# Altium footprint library miniVent_PCB_v1_01.PcbLib: 32 footprints (part 1 of 2)
Each footprint in its own frame and in the unit in brackets; x right, y up, seen from the top. Pads: shape width x height; smd on the part's side, far side on the other; paste and mask are expansions set on the pad; w line width, h text height; cw(c..) or ccw(c..) is an arc to the next point about the centre after c.
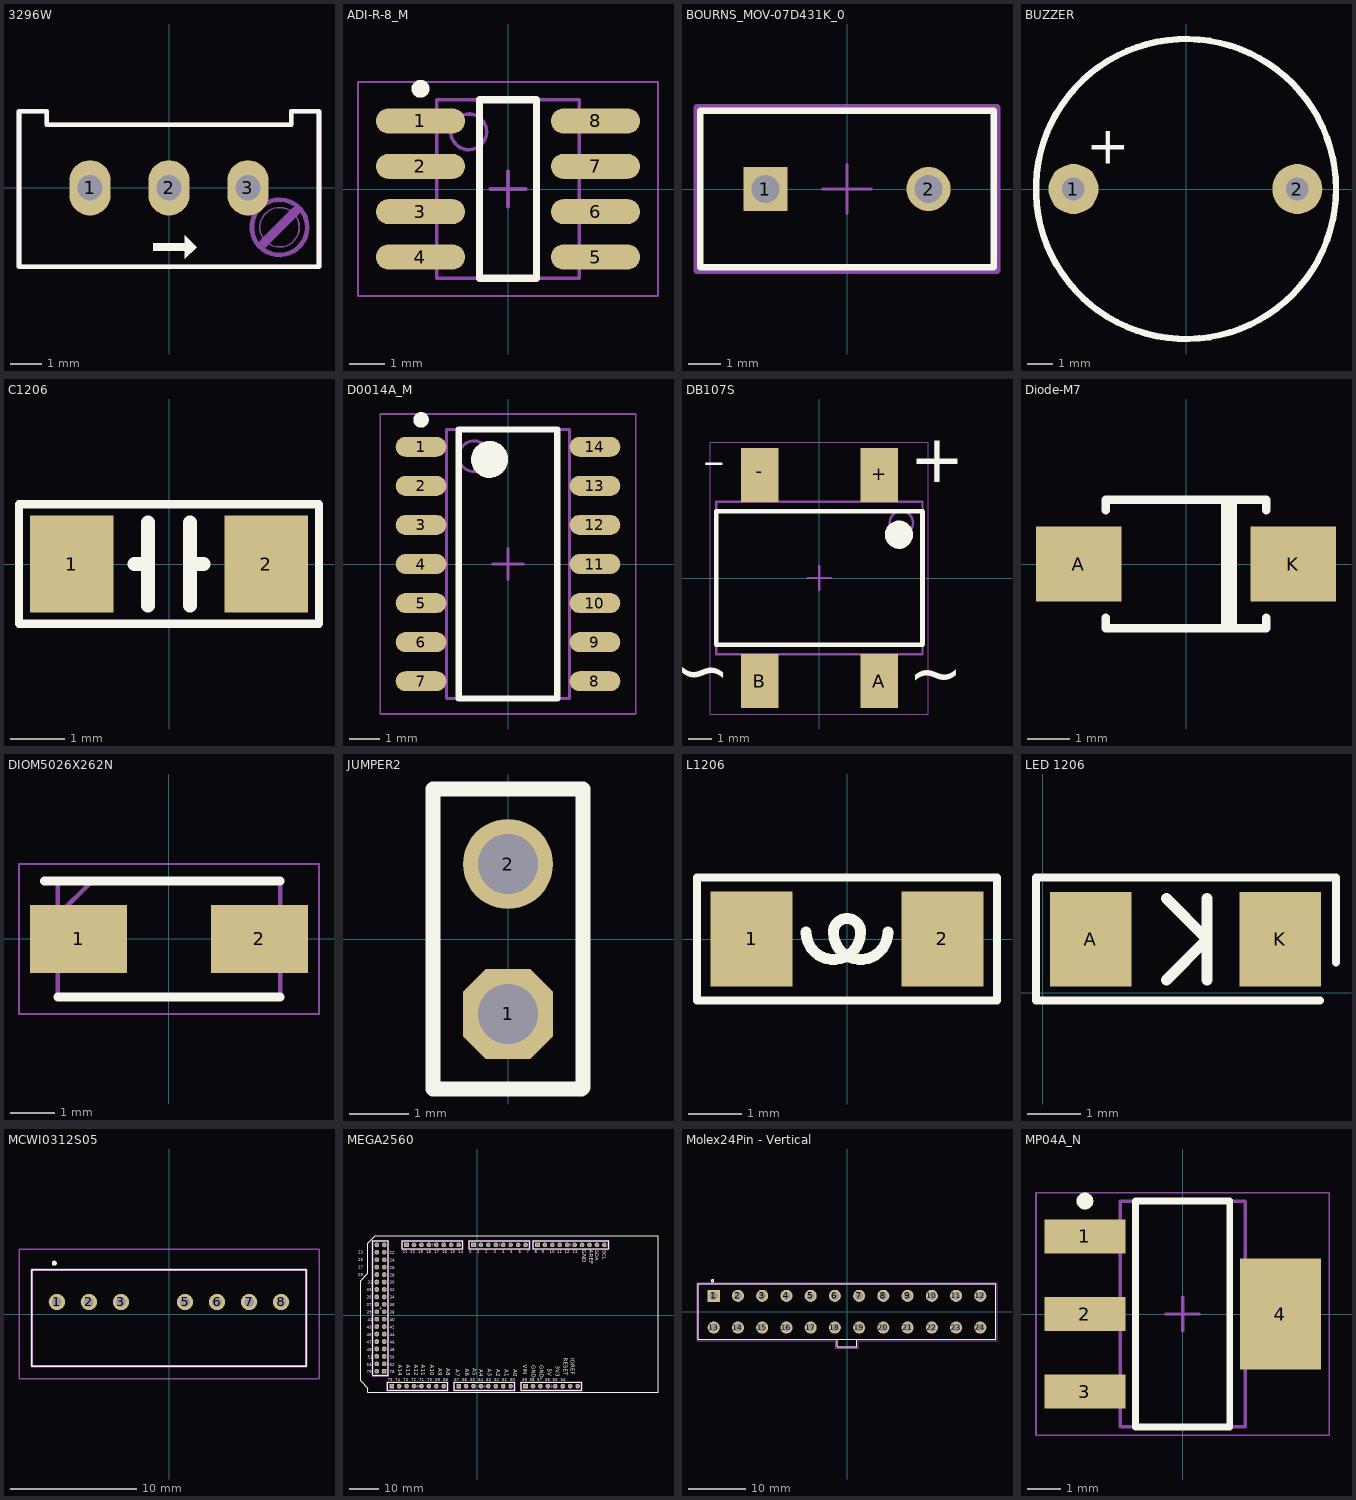
[diagram p0: the footprints below, top view; thin cyan lines are the x and y axes]

## 3296W [mil]
pads (3):
  oval 52x70 hole 32: 1(-100,0) 2(0,0) 3(100,0)
Top Overlay:
  rectangle: -19.99,-80 20.01,-70
  region: 20,-60 20,-90 35,-75
  lines w6: -190,-100 -190,97 -155,97 -155,80 155,80 155,97 190,97 190,-100 -190,-100
Mechanical 1:
  circle w6: c140,-50 r35
  circle w2: c140,-50 r25
  lines w6: -190,-100 190,-100 190,97 155,97 155,80 -155,80 -155,97 -190,97 -190,-100
  lines w12: 120,-70 160,-30
3D body "SW3dPS-bourns 3296W pot.STEP": height 454.72, standoff -251.97, extent -187.19,-96 188,94.2

## ADI-R-8_M [mm] "SOIC, 8-Leads, Body 4.9x3.9mm, Pitch 1.27mm, IPC Low Density"
height 1.75
pads (8):
  oval 2.5x0.7 smd: 1(-2.45,1.905) 2(-2.45,0.635) 3(-2.45,-0.635) 4(-2.45,-1.905) 5(2.45,-1.905) 6(2.45,-0.635) 7(2.45,0.635) 8(2.45,1.905)
Top Overlay:
  circle w0.25: c-2.45,2.805 r0.125
  lines w0.2: -0.8,-2.5 -0.8,2.5 0.8,2.5 0.8,-2.5 -0.8,-2.5
Mechanical 13:
  circle w0.1: c-1.1,1.6 r0.5
  lines w0.1: -2,-2.5 -2,2.5 2,2.5 2,-2.5 -2,-2.5
Mechanical 15:
  lines w0.05: -4.2,-3 -4.2,3 4.2,3 4.2,-3 -4.2,-3
  lines w0.1: -0.5,0 0.5,0 ; 0,-0.5 0,0.5
3D body: height 1.75, standoff 0.1, extent -2,-2.5 2,2.5

## BOURNS_MOV-07D431K_0 [mm]
pads (2):
  rect 1.35x1.35 hole 0.85 paste-1000 mask+0: 1(-2.5,0)
  round 1.35 hole 0.85 paste-1000 mask+0: 2(2.5,0)
Top Overlay:
  lines w0.2: -4.5,-2.4 4.5,-2.4 4.5,2.4 -4.5,2.4 -4.5,-2.4
Mechanical 10:
  lines w0.2: -4.6,-2.5 4.6,-2.5 4.6,2.5 -4.6,2.5 -4.6,-2.5
  text ".Designator" at 0,0 h1
Mechanical 12:
  lines w0.15: -4.5,-2.4 4.5,-2.4 4.5,2.4 -4.5,2.4 -4.5,-2.4
Mechanical 15:
  lines w0.1: -0.75,0 0.75,0 ; 0,-0.75 0,0.75
  lines w0.2: -4.6,-2.5 4.6,-2.5 4.6,2.5 -4.6,2.5 -4.6,-2.5
3D body "3dmodel.step": height 0.25, standoff 0, extent -4.6,-2.5 4.6,2.5

## BUZZER [mm] "BUZZER"
pads (2):
  round 2 hole 0.9: 1(-4.5,0) 2(4.45,0)
Top Overlay:
  circle w0.254: c0,0 r6
  text "+" at -4,1 h1.52

## C1206 [mil]
pads (2):
  rect 60x70 smd: 1(-70,0) 2(70,0)
Top Overlay:
  lines w5.91: -107.87,-42.91 -107.87,42.91 107.87,42.91 107.87,-42.91 -107.87,-42.91
  lines w10: -25,0 -15,0 ; -15,-30 -15,30 ; 15,-30 15,30 ; 15,0 25,0
3D body "User Library-cap1206.STEP": height 37.4, standoff -0.39, extent -80.43,-34.09 84.92,36.77

## D0014A_M [mm] "SOIC, 14-Leads, Body 8.75x4mm, Pitch 1.27mm, IPC Low Density"
height 1.75
pads (14):
  oval 1.65x0.65 smd: 1(-2.825,3.81) 2(-2.825,2.54) 3(-2.825,1.27) 4(-2.825,0) 5(-2.825,-1.27) 6(-2.825,-2.54) 7(-2.825,-3.81) 8(2.825,-3.81) 9(2.825,-2.54) 10(2.825,-1.27) 11(2.825,0) 12(2.825,1.27) 13(2.825,2.54) 14(2.825,3.81)
Top Overlay:
  circle w0.6: c-0.6,3.4 r0.3
  circle w0.25: c-2.825,4.685 r0.125
  lines w0.2: -1.6,-4.375 1.6,-4.375 1.6,4.375 -1.6,4.375 -1.6,-4.375
Mechanical 13:
  circle w0.1: c-1.1,3.5 r0.5
  lines w0.1: -2,-4.375 2,-4.375 2,4.375 -2,4.375 -2,-4.375
Mechanical 15:
  lines w0.05: -4.15,-4.875 4.15,-4.875 4.15,4.875 -4.15,4.875 -4.15,-4.875
  lines w0.1: -0.5,0 0.5,0 ; 0,-0.5 0,0.5
3D body "SOIC-14akaD0014AakaM14A.stp": height 1.59, standoff -0.01, extent -3.023,-4.318 3.022,4.318

## DB107S [mm] "SOP, 4-Leads, Body 8.30x6.35mm, Pitch 5.10mm, IPC Medium Density"
height 3.4
pads (4):
  rect 1.6x2.3 smd: +(2.55,4.4) -(-2.55,4.4) A(2.55,-4.4) B(-2.55,-4.4)
Top Overlay:
  circle w0.6: c3.4,1.85 r0.3
  lines w0.2: -4.4,-2.85 -4.4,2.85 4.4,2.85 4.4,-2.85 -4.4,-2.85
  text "+" at 3.861,3.4 h3.5
  text "-" at -5,3.5 h3.5
  text "~" at 3.8,-5.7 h3.5
  text "~" at -3.8,-5.6 h3.5
Mechanical 13:
  circle w0.1: c3.5,2.35 r0.5
  lines w0.1: -4.4,-3.25 -4.4,3.25 4.4,3.25 4.4,-3.25 -4.4,-3.25
Mechanical 15:
  lines w0.05: -4.65,-5.8 -4.65,5.8 4.65,5.8 4.65,-5.8 -4.65,-5.8
  lines w0.1: -0.5,0 0.5,0 ; 0,-0.5 0,0.5
3D body "SOP510P990X340-4N.step": height 3.4, standoff 0, extent -4.4,-4.95 4.4,4.95

## Diode-M7 [mil]
pads (2):
  rect 80x70 smd: A(-100,0) K(100,0)
Top Overlay:
  lines w7.87: -75,-60 75,-60 ; -75,60 75,60
  lines w8: -75,-60 -75,-50 ; -75,50 -75,60 ; 75,-60 75,-50 ; 75,50 75,60
  lines w15: 40,-55 40,55

## DIOM5026X262N [mm]
pads (2):
  rect 2.2x1.55 smd: 1(-2.05,0) 2(2.05,0)
Top Overlay:
  lines w0.2: -2.825,1.312 2.52,1.312 ; -2.52,-1.312 2.52,-1.312
Mechanical 13:
  lines w0.1: -2.52,0.538 -1.745,1.312 ; -2.52,-1.312 2.52,-1.312 2.52,1.312 -2.52,1.312 -2.52,-1.312
Mechanical 15:
  lines w0.05: -3.4,-1.7 3.4,-1.7 3.4,1.7 -3.4,1.7 -3.4,-1.7
3D body "SS34A.stp": height 2.62, standoff 0, extent -2.52,-1.312 2.52,1.312

## JUMPER2 [mil]
pads (2):
  oct 60x60 hole 40: 1(0,-50)
  round 60 hole 40: 2(0,50)
Top Overlay:
  lines w10: -50,-100 -50,100 50,100 50,0 50,-99 49,-100 -50,-100
3D body "pin_header_aw_108_02-t.stp": height 98.11, standoff -390.08, extent -53.28,-95 45,105
3D body "jumper_aksct_g-black.stp": height 404.72, standoff 150, extent -46.06,-98.03 50,98.03

## L1206 [mil]
pads (2):
  rect 60x70 smd: 1(-70,0) 2(70,0)
Top Overlay:
  lines w5.91: -110,-45 -110,45 110,45 110,-45 -110,-45
  lines w8: -30,5 ccw(c-10,5) 10,5 ccw(c0,5) -10,5 ccw(c10,5) 30,5
3D body "User Library-1206 Ferrite bead.step": height 49.25, standoff -2.01, extent -64.56,-31.46 61.43,31.54

## LED 1206 [mil]
pads (2):
  rect 60x70 smd: A(35.43,39.37) K(175.43,39.37)
Top Overlay:
  lines w5.91: 204.72,-5.91 -5,-5.91 -5,85 216.54,85 216.54,22.05
  lines w8: 91.3,9.37 121.3,39.37 91.3,69.37 ; 121.3,9.37 121.3,69.37
3D body "User Library-LED 1206 BLUE.step": height 43.31, standoff 0, extent 40.95,7.87 166.94,70.87

## MCWI0312S05 [mm]
pads (7):
  round 1.303 hole 0.76: 1(-8.89,0.953) 2(-6.35,0.953) 3(-3.81,0.953) 5(1.27,0.953) 6(3.81,0.953) 7(6.35,0.953) 8(8.89,0.953)
Top Overlay:
  lines w0.1: -10.9,-4.127 10.9,-4.127 10.9,3.528 -10.9,3.528 -10.9,-4.127
  lines w0.2: -9.199,4.028 ccw(c-9.099,4.028) -9,4.028 ccw(c-9.099,4.028) -9.199,4.028
Mechanical 13:
  lines w0.2: -10.9,-4.127 10.9,-4.127 10.9,3.528 -10.9,3.528 -10.9,-4.127
Mechanical 15:
  lines w0.1: -11.9,-5.127 11.9,-5.127 11.9,5.127 -11.9,5.127 -11.9,-5.127

## MEGA2560 [mm] "Arduino 2560"
pads (86):
  rect 1.6x1.6 hole 1.1: 0(-1.27,24.13) 8(20.574,24.13) 21(-24.13,24.13) 59(16.51,-24.13) 67(-6.35,-24.13) 75(-29.21,-24.13)
  round 1.6 hole 1.1: 1(1.27,24.13) 2(3.81,24.13) 3(6.35,24.13) 4(8.89,24.13) 5(11.43,24.13) 6(13.97,24.13) 7(16.51,24.13) 9(23.114,24.13) 10(25.654,24.13) 11(28.194,24.13) 12(30.734,24.13) 13(33.274,24.13) 14(-6.35,24.13) 15(-8.89,24.13) 16(-11.43,24.13) 17(-13.97,24.13) 18(-16.51,24.13) 19(-19.05,24.13) 20(-21.59,24.13) 54(29.21,-24.13) 55(26.67,-24.13) 56(24.13,-24.13) 57(21.59,-24.13) 58(19.05,-24.13) 60(11.43,-24.13) 61(8.89,-24.13) 62(6.35,-24.13) 63(3.81,-24.13) 64(1.27,-24.13) 65(-1.27,-24.13) 66(-3.81,-24.13) 68(-11.43,-24.13) 69(-13.97,-24.13) 70(-16.51,-24.13) 71(-19.05,-24.13) 72(-21.59,-24.13) 73(-24.13,-24.13) 74(-26.67,-24.13) 76(35.814,24.13) 77(38.354,24.13) 82(40.894,24.13) 83(43.434,24.13) 84(31.75,-24.13) 85(34.29,-24.13)
  round 1.65 hole 1.1: 22(-31.75,21.59) 23(-34.29,21.59) 24(-31.75,19.05) 25(-34.29,19.05) 26(-31.75,16.51) 27(-34.29,16.51) 28(-31.75,13.97) 29(-34.29,13.97) 30(-31.75,11.43) 31(-34.29,11.43) 32(-31.75,8.89) 33(-34.29,8.89) 34(-31.75,6.35) 35(-34.29,6.35) 36(-31.75,3.81) 37(-34.29,3.81) 38(-31.75,1.27) 39(-34.29,1.27) 40(-31.75,-1.27) 41(-34.29,-1.27) 42(-31.75,-3.81) 43(-34.29,-3.81) 44(-31.75,-6.35) 45(-34.29,-6.35) 46(-31.75,-8.89) 47(-34.29,-8.89) 48(-31.75,-11.43) 49(-34.29,-11.43) 50(-31.75,-13.97) 51(-34.29,-13.97) 52(-31.75,-16.51) 53(-34.29,-16.51) 79(-34.29,-19.05) 80(-34.29,24.13) 81(-31.75,24.13)
  rect 1.65x1.65 hole 1.1: 78(-31.75,-19.05)
Top Overlay:
  lines w0.2: -35.635,-20.47 -30.405,-20.47 -30.405,25.55 -35.635,25.55 -35.635,-20.47 ; -30.63,-25.475 -10.01,-25.475 -10.01,-22.785 -30.63,-22.785 -30.63,-25.475 ; -25.55,22.785 -4.93,22.785 -4.93,25.475 -25.55,25.475 -25.55,22.785 ; -7.77,-25.475 12.85,-25.475 12.85,-22.785 -7.77,-22.785 -7.77,-25.475 ; -2.69,22.785 17.93,22.785 17.93,25.475 -2.69,25.475 -2.69,22.785 ; 15.09,-25.475 35.71,-25.475 35.71,-22.785 15.09,-22.785 15.09,-25.475 ; 19.154,22.785 19.154,25.475 44.854,25.475 44.854,22.785 19.154,22.785
  lines w0.254: -37.31,14.469 -39.85,11.929 -39.85,-22.351 -37.31,-24.891 -37.31,-26.161 60.11,-26.161 61.75,-26.161 61.75,-24.521 61.75,27.179 -34.77,27.179 -37.31,24.639 -37.31,14.479
  text "66" at -5.135,-22.427 h1.02
  text "69" at -14.346,-22.427 h1.02
  text "12" at 29.945,21.284 h1.02
  text "GND" at 35.28,22.452 h2.36
  text "AREF" at 37.82,22.452 h2.36
  text "SCL" at 42.879,22.331 h1.21
  text "SDA" at 40.288,22.331 h1.21
  text "14" at -6.398,21.284 h1.02
  text "15" at -9.138,21.284 h1.02
  text "16" at -11.878,21.284 h1.02
  text "17" at -14.617,21.284 h1.02
  text "18" at -17.357,21.284 h1.02
  text "19" at -20.096,21.284 h1.02
  text "20" at -22.836,21.284 h1.02
  text "21" at -25.423,21.284 h1.02
  text "7" at 16.97,21.284 h1.02
  text "6" at 14.139,21.284 h1.02
  text "5" at 11.309,21.284 h1.02
  text "4" at 8.479,21.284 h1.02
  text "3" at 5.648,21.284 h1.02
  text "2" at 2.818,21.284 h1.02
  text "1" at -0.012,21.284 h1.02
  text "0" at -2.69,21.284 h1.02
  text "8" at 19.662,21.284 h1.02
  text "13" at 32.554,21.284 h1.02
  text "11" at 27.336,21.284 h1.02
  text "10" at 24.727,21.284 h1.02
  text "9" at 22.119,21.284 h1.02
  text "22" at -29.92,20.953 h1.02
  text "24" at -29.92,18.405 h1.02
  text "26" at -29.92,15.857 h1.02
  text "28" at -29.92,13.309 h1.02
  text "30" at -29.92,10.761 h1.02
  text "32" at -29.92,8.213 h1.02
  text "34" at -29.92,5.665 h1.02
  text "36" at -29.92,3.117 h1.02
  text "38" at -29.92,0.569 h1.02
  text "40" at -29.92,-1.979 h1.02
  text "42" at -29.92,-4.527 h1.02
  text "44" at -29.92,-7.075 h1.02
  text "46" at -29.92,-9.623 h1.02
  text "48" at -29.92,-12.171 h1.02
  text "50" at -29.92,-14.719 h1.02
  text "52" at -29.92,-17.266 h1.02
  text "78" at -29.92,-19.662 h1.02
  text "23" at -40.715,21.08 h1.02
  text "25" at -40.715,18.532 h1.02
  text "27" at -40.715,15.984 h1.02
  text "29" at -40.715,13.436 h1.02
  text "31" at -37.455,10.761 h1.02
  text "33" at -37.794,8.213 h1.02
  text "35" at -37.794,5.665 h1.02
  text "37" at -37.794,3.117 h1.02
  text "39" at -37.794,0.569 h1.02
  text "41" at -37.455,-1.979 h1.02
  text "43" at -37.794,-4.527 h1.02
  text "45" at -37.794,-7.075 h1.02
  text "47" at -37.794,-9.623 h1.02
  text "49" at -37.794,-12.171 h1.02
  text "51" at -37.455,-14.719 h1.02
  text "53" at -37.794,-17.266 h1.02
  text "79" at -37.794,-19.662 h1.02
  text "68" at -11.587,-22.427 h1.02
  text "70" at -17.086,-22.427 h1.02
  text "71" at -19.825,-22.427 h1.02
  text "72" at -22.565,-22.427 h1.02
  text "73" at -25.304,-22.427 h1.02
  text "74" at -28.044,-22.427 h1.02
  text "75" at -30.631,-22.427 h1.02
  text "60" at 11.255,-22.427 h1.02
  text "61" at 8.515,-22.427 h1.02
  text "62" at 5.775,-22.427 h1.02
  text "63" at 3.036,-22.427 h1.02
  text "64" at 0.296,-22.427 h1.02
  text "65" at -2.443,-22.427 h1.02
  text "67" at -7.77,-22.427 h1.02
  text "59" at 15.446,-22.427 h1.02
  text "58" at 17.935,-22.427 h1.02
  text "54" at 28.501,-22.427 h1.02
  text "55" at 25.86,-22.427 h1.02
  text "56" at 23.218,-22.427 h1.02
  text "57" at 20.576,-22.427 h1.02
  text "IOREF" at 31.496,-14.598 h2.36
  text "RESET" at 29.096,-14.51 h2.36
  text "3V3" at 26.336,-17.183 h2.36
  text "5V" at 23.575,-18.256 h2.36
  text "GND" at 20.814,-16.992 h2.36
  text "GND" at 18.054,-16.992 h2.36
  text "A0" at 11.762,-18.288 h2.36
  text "A1" at 8.858,-18.288 h2.36
  text "A2" at 5.953,-18.302 h2.36
  text "VIN" at 15.293,-16.886 h2.36
  text "A3" at 3.048,-18.263 h2.36
  text "A4" at 0.144,-18.306 h2.36
  text "A5" at -2.058,-18.07 h2.36
  text "A6" at -4.598,-18.237 h2.36
  text "A7" at -7.922,-18.309 h2.36
  text "A8" at -11.049,-18.098 h2.36
  text "A9" at -13.808,-18.045 h2.36
  text "A10" at -16.548,-16.846 h2.36
  text "A11" at -19.612,-16.846 h2.36
  text "A13" at -24.767,-16.82 h2.36
  text "A12" at -22.027,-16.859 h2.36
  text "A14" at -27.492,-16.864 h2.36
Mechanical 13:
  lines w0.1: -35.56,-20.32 -35.56,25.4 -30.48,25.4 -30.48,-20.32 -35.56,-20.32 ; -30.48,-25.4 -30.48,-22.86 -10.16,-22.86 -10.16,-25.4 -30.48,-25.4 ; -25.4,22.86 -25.4,25.4 -5.08,25.4 -5.08,22.86 -25.4,22.86 ; -7.62,-25.4 -7.62,-22.86 12.7,-22.86 12.7,-25.4 -7.62,-25.4 ; -2.54,22.86 -2.54,25.4 17.78,25.4 17.78,22.86 -2.54,22.86 ; 15.24,-25.4 15.24,-22.86 35.56,-22.86 35.56,-25.4 15.24,-25.4 ; 19.304,22.86 44.704,22.86 44.704,25.4 19.304,25.4 19.304,22.86
Mechanical 15:
  lines w0.05: -33.52,2.54 -32.52,2.54 ; -33.02,2.04 -33.02,3.04 ; -20.82,-24.13 -19.82,-24.13 ; -20.32,-24.63 -20.32,-23.63 ; -15.74,24.13 -14.74,24.13 ; -15.24,23.63 -15.24,24.63 ; 2.04,-24.13 3.04,-24.13 ; 2.54,-24.63 2.54,-23.63 ; 7.12,24.13 8.12,24.13 ; 7.62,23.63 7.62,24.63 ; 24.9,-24.13 25.9,-24.13 ; 25.4,-24.63 25.4,-23.63 ; 31.504,24.13 32.504,24.13 ; 32.004,23.63 32.004,24.63 ; -35.835,-20.67 -30.205,-20.67 -30.205,25.75 -35.835,25.75 -35.835,-20.67 ; -30.83,-25.675 -30.83,-22.585 -9.81,-22.585 -9.81,-25.675 -30.83,-25.675 ; -25.75,22.585 -25.75,25.675 -4.73,25.675 -4.73,22.585 -25.75,22.585 ; -7.97,-25.675 -7.97,-22.585 13.05,-22.585 13.05,-25.675 -7.97,-25.675 ; -2.89,22.585 -2.89,25.675 18.13,25.675 18.13,22.585 -2.89,22.585 ; 14.89,-25.675 14.89,-22.585 35.91,-22.585 35.91,-25.675 14.89,-25.675 ; 18.954,22.585 45.054,22.585 45.054,25.675 18.954,25.675 18.954,22.585
3D body "61300811121.stp": height 8.57, standoff -2.97, extent -25.4,22.86 -5.08,25.4
3D body "61300811121.stp": height 8.57, standoff -2.97, extent -2.54,22.86 17.78,25.4
3D body "61303621121.stp": height 8.59, standoff -2.95, extent -35.56,-20.32 -30.48,25.4
3D body "61300811121.stp": height 8.57, standoff -2.97, extent -30.48,-25.4 -10.16,-22.86
3D body "61300811121.stp": height 8.57, standoff -2.97, extent -7.62,-25.4 12.7,-22.86
3D body "61301011121.stp": height 8.57, standoff -2.97, extent 19.304,22.86 44.704,25.4
3D body "61300811121.stp": height 8.57, standoff -2.97, extent 15.24,-25.4 35.56,-22.86
3D body "arduino MEGA2650.SLDPRT": height 16.2, standoff 0.95, extent -39.878,-26.162 68.072,27.178

## Molex24Pin - Vertical [mm] "Molex ATX 24Pin"
height 8.54
pads (24):
  rect 2.1x2.1 hole 1.4: 1(-23.1,2.75)
  round 2.1 hole 1.4: 2(-18.9,2.75) 3(-14.7,2.75) 4(-10.5,2.75) 5(-6.3,2.75) 6(-2.1,2.75) 7(2.1,2.75) 8(6.3,2.75) 9(10.5,2.75) 10(14.7,2.75) 11(18.9,2.75) 12(23.1,2.75) 13(-23.1,-2.75) 14(-18.9,-2.75) 15(-14.7,-2.75) 16(-10.5,-2.75) 17(-6.3,-2.75) 18(-2.1,-2.75) 19(2.1,-2.75) 20(6.3,-2.75) 21(10.5,-2.75) 22(14.7,-2.75) 23(18.9,-2.75) 24(23.1,-2.75)
Top Overlay:
  circle w0.203: c-23.3,5.35 r0.2
  lines w0.127: -1.7,-4.8 1.7,-4.8 ; -1.7,-4.8 -25.75,-4.8 -25.75,4.8 25.75,4.8 25.75,-4.8 1.7,-4.8 ; -1.7,-4.8 -1.7,-6.1 1.7,-6.1 1.7,-4.8
Mechanical 13:
  circle w0.203: c-23.3,5.35 r0.2
  lines w0.127: -1.7,-4.8 -25.75,-4.8 -25.75,4.8 25.75,4.8 25.75,-4.8 1.7,-4.8 ; -1.7,-4.8 1.7,-4.8 ; -1.7,-4.8 -1.7,-6.1 1.7,-6.1 1.7,-4.8
Mechanical 15:
  lines w0.05: -26,-5.05 -1.95,-5.05 -1.95,-6.35 1.95,-6.35 1.95,-5.05 26,-5.05 26,5.05 -26,5.05 -26,-0.54 -26,-4.04 -26,-5.05
3D body "plug_cpu_power_female_24-pin.stp": height 24.88, standoff 0, extent -26.67,-6.096 27.23,6.204

## MP04A_N [mm] "SOT223, 4-Leads, Body 6.5x3.5mm, Pitch 2.3mm, Lead Span 7mm, IPC Medium Density"
height 1.8
pads (4):
  rect 2.4x1 smd: 1(-2.9,2.3) 2(-2.9,0) 3(-2.9,-2.3)
  rect 2.4x3.3 smd: 4(2.9,0)
Top Overlay:
  circle w0.25: c-2.9,3.35 r0.125
  lines w0.2: -1.4,-3.35 -1.4,3.35 1.4,3.35 1.4,-3.35 -1.4,-3.35
Mechanical 13:
  lines w0.1: -1.855,-3.35 -1.855,3.35 1.855,3.35 1.855,-3.35 -1.855,-3.35
Mechanical 15:
  lines w0.05: -4.35,-3.6 -4.35,3.6 4.35,3.6 4.35,-3.6 -4.35,-3.6
  lines w0.1: -0.5,0 0.5,0 ; 0,-0.5 0,0.5
3D body: height 1.8, standoff 0.03, extent -1.855,-3.35 1.855,3.35